# Altium footprint library DIY Air Quality Monitor Library.PcbLib: 11 footprints
Each footprint in its own frame and in the unit in brackets; x right, y up, seen from the top. Pads: shape width x height; smd on the part's side, far side on the other; paste and mask are expansions set on the pad; w line width, h text height; cw(c..) or ccw(c..) is an arc to the next point about the centre after c.
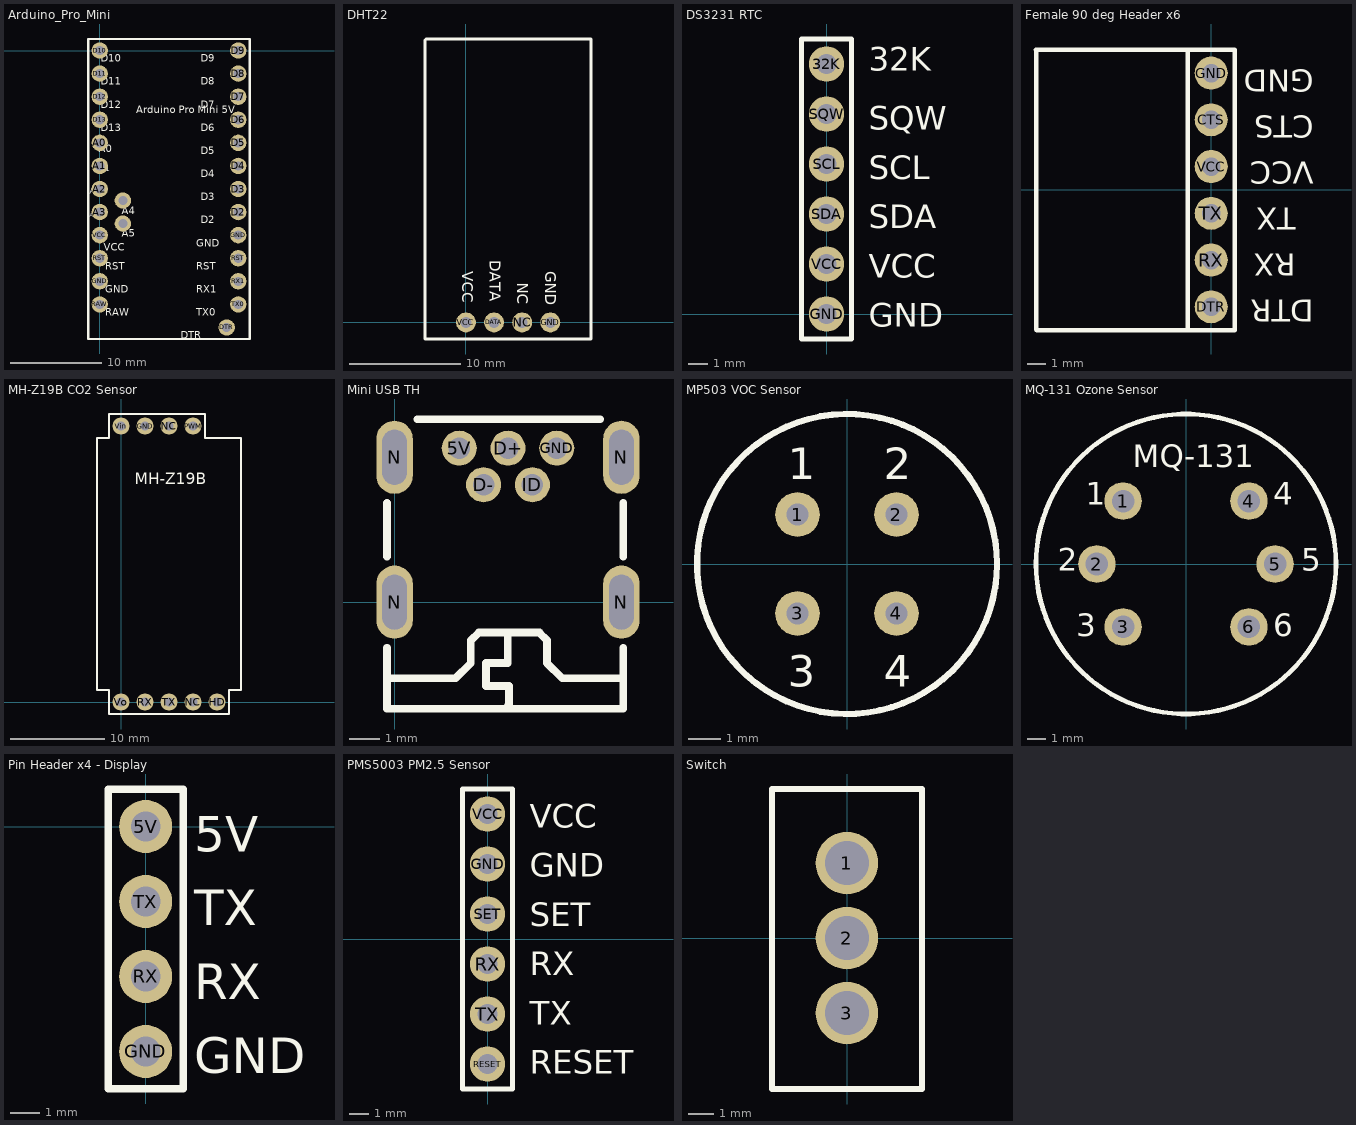
[diagram p0: the footprints below, top view; thin cyan lines are the x and y axes]

## Arduino_Pro_Mini [mm] "5V Board"
pads (27):
  round 1.8 hole 1: A0(0,-10.16) A1(0,-12.7) A2(0,-15.24) A3(0,-17.78) A4/SDA(2.54,-16.51) A5/SCL(2.54,-19.05) D2(15.24,-17.78) D3(15.24,-15.24) D4(15.24,-12.7) D5(15.24,-10.16) D6(15.24,-7.62) D7(15.24,-5.08) D8(15.24,-2.54) D9(15.24,0) D10(0,0) D11(0,-2.54) D12(0,-5.08) D13(0,-7.62) DTR(13.97,-30.48) GND(0,-25.4) GND(15.24,-20.32) RAW(0,-27.94) RST(0,-22.86) RST(15.24,-22.86) RX1(15.24,-25.4) TX0(15.24,-27.94) VCC(0,-20.32)
Top Overlay:
  lines w0.254: -1.27,-31.75 -1.27,1.27 16.51,1.27 16.51,-31.75 -1.27,-31.75
  text "D8" at 11.095,-3.79 h0.8
  text "D7" at 11.095,-6.33 h0.8
  text "D6" at 11.095,-8.87 h0.8
  text "D5" at 11.095,-11.41 h0.8
  text "D4" at 11.095,-13.95 h0.8
  text "D3" at 11.095,-16.49 h0.8
  text "D2" at 11.095,-19.03 h0.8
  text "GND" at 10.628,-21.57 h0.8
  text "RST" at 10.628,-24.11 h0.8
  text "RX1" at 10.628,-26.65 h0.8
  text "TX0" at 10.628,-29.19 h0.8
  text "D9" at 11.095,-1.25 h0.8
  text "D11" at 0.095,-3.79 h0.8
  text "D12" at 0.095,-6.33 h0.8
  text "D13" at 0.095,-8.87 h0.8
  text "A0" at -0.112,-11.2 h0.8
  text "A1" at -0.112,-13.28 h0.7
  text "VCC" at 0.428,-22.02 h0.8
  text "RST" at 0.595,-24.11 h0.8
  text "GND" at 0.595,-26.65 h0.8
  text "RAW" at 0.595,-29.19 h0.8
  text "A2" at -1.112,-15.78 h0.6
  text "A5" at 2.428,-20.52 h0.8
  text "Arduino Pro Mini 5V" at 4.028,-6.887 h0.8
  text "D10" at 0.095,-1.25 h0.8
  text "DTR" at 8.935,-31.73 h0.8
  text "A3" at -1.112,-18.28 h0.4
  text "A4" at 2.428,-18.02 h0.8
3D body "Arduino Pro Mini Board 3D Model.STEP": height 6.61, standoff -5.7, extent -1.63,-32 16.87,1.5

## DHT22 [mm]
pads (4):
  round 1.8 hole 1: DATA(2.54,0) GND(7.62,0) NC(5.08,0) VCC(0,0)
Top Overlay:
  lines w0.254: -3.7,-1.5 11.3,-1.5 11.3,25.6 -3.6,25.6 -3.7,25.5 -3.7,-1.5
  text "NC" at 4.65,3.6 h1
  text "GND" at 7.15,4.6 h1
  text "DATA" at 2.15,5.6 h1
  text "VCC" at -0.35,4.6 h1
3D body "DHT22 v5.STEP": height 7.8, standoff -5.05, extent -3.84,-0.3 11.46,25.45

## DS3231 RTC [mm] "DS3231 RTC"
pads (6):
  round 1.8 hole 1: 32K(0,12.7) GND(0,0) SCL(0,7.62) SDA(0,5.08) SQW(0,10.16) VCC(0,2.54)
Top Overlay:
  lines w0.254: -1.27,-1.27 -1.27,13.97 1.27,13.97 1.27,-1.27 -1.27,-1.27
  text "GND" at 2.15,-0.65 h1.2
  text "VCC" at 2.15,1.85 h1.2
  text "SDA" at 2.15,4.35 h1.2
  text "SCL" at 2.15,6.85 h1.2
  text "SQW" at 2.15,9.35 h1.2
  text "32K" at 2.15,12.35 h1.2
3D body "DS3231 Real Time Clock Module.STEP": height 13.41, standoff -5.7, extent -37.23,-4.9 1.27,17.6

## Female 90 deg Header x6 [mm] "Female 90 deg Header x6"
pads (6):
  round 1.8 hole 1: CTS(0,3.81) DTR(0,-6.35) GND(0,6.35) RX(0,-3.81) TX(0,-1.27) VCC(0,1.27)
Top Overlay:
  lines w0.254: -1.27,-7.62 -9.48,-7.62 -9.5,-7.6 -9.5,7.6 -9.52,7.62 -1.27,7.62 ; -1.27,-7.62 -1.27,7.62 ; -1.27,-7.62 1.27,-7.62 1.27,7.62 -1.27,7.62
  text "GND" at 5.58,6.523 h1.2
  text "CTS" at 5.58,4.023 h1.2
  text "VCC" at 5.58,1.523 h1.2
  text "TX" at 4.58,-0.977 h1.2
  text "RX" at 4.58,-3.477 h1.2
  text "DTR" at 5.58,-5.977 h1.2
3D body "Female 90 deg Header x6.STEP": height 2.52, standoff -2.25, extent -9.5,-7.62 0.2,7.62

## MH-Z19B CO2 Sensor [mm]
pads (9):
  round 1.8 hole 1: GND(2.54,29.21) HD(10.16,0) NC(5.08,29.21) NC(7.62,0) PWM(7.62,29.21) RX(2.54,0) TX(5.08,0) Vin(0,29.21) Vo(0,0)
Top Overlay:
  lines w0.254: -2.54,1.27 -2.54,27.94 -1.27,27.94 -1.27,30.48 8.89,30.48 8.89,27.94 12.7,27.94 12.7,1.27 11.43,1.27 11.43,-1.27 -1.27,-1.27 -1.27,1.27 -2.54,1.27
  text "MH-Z19B" at 1.47,23.06 h1.2
3D body "MH-Z19B CO2 Sensor - with pin headers.STEP": height 11.31, standoff -5.7, extent -4.6,-1.35 15.4,30.55

## Mini USB TH [mm]
pads (9):
  round 1.15 hole 0.7: 5V(2.12,5.05) D+(3.72,5.05) D-(2.92,3.85) GND(5.32,5.05) ID(4.52,3.85)
  oval 1.2x2.4 hole 0.8 slot 1.8 at 90 deg: N(0,0) N(0,4.75) N(7.44,0) N(7.44,4.75)
Top Overlay:
  lines w0.254: -0.25,-2.5 2,-2.5 2.5,-2 2.5,-1.26 2.76,-1 4.75,-1 5,-1.25 5,-2 5.5,-2.5 7.5,-2.5 ; -0.25,-1.5 -0.25,-3.5 7.5,-3.5 7.5,-1.5 ; -0.25,1.5 -0.25,3.25 ; 0.75,6 6.75,6 ; 3.625,-3.5 3.75,-3.375 3.75,-2.75 3.458,-2.75 3,-2.75 3,-2 3.25,-2 3.713,-2 3.713,-1 ; 7.5,1.5 7.5,3.25
3D body "Mini USB TH.stp": height 3.95, standoff -1.8, extent -0.15,-3.7 7.55,5.3

## MP503 VOC Sensor [mm]
pads (4):
  round 1.4 hole 0.7: 1(-1.55,1.55) 2(1.55,1.55) 3(-1.55,-1.55) 4(1.55,-1.55)
Top Overlay:
  circle w0.2: c0,0 r4.7
  text "2" at 1.15,2.65 h1
  text "1" at -1.85,2.65 h1
  text "3" at -1.85,-3.85 h1
  text "4" at 1.15,-3.85 h1
3D body "MP503 VOC Sensor v3.step": height 8.1, standoff -2, extent -4.7,-4.7 4.7,5.5

## MQ-131 Ozone Sensor [mm]
pads (6):
  round 2 hole 1.2: 1(-3.359,3.359) 2(-4.75,0) 3(-3.359,-3.359) 4(3.359,3.359) 5(4.75,0) 6(3.359,-3.359)
Top Overlay:
  circle w0.254: c0,0 r8
  text "MQ-131" at -2.85,5.15 h1.2
  text "1" at -5.35,3.15 h1.2
  text "2" at -6.85,-0.35 h1.2
  text "3" at -5.85,-3.85 h1.2
  text "6" at 4.65,-3.85 h1.2
  text "5" at 6.15,-0.35 h1.2
  text "4" at 4.65,3.15 h1.2
3D body "MQ-131 Ozone Sensor.STEP": height 14, standoff -7.5, extent -8,-8 8,8

## Pin Header x4 - Display [mm] "Pin Header x4 - Display"
pads (4):
  round 1.8 hole 1: 5V(0,0) GND(0,-7.62) RX(0,-5.08) TX(0,-2.54)
Top Overlay:
  lines w0.254: -1.27,-8.89 1.27,-8.89 1.27,1.27 -1.27,1.27 -1.27,-8.89
  text "5V" at 1.65,-0.85 h1.2
  text "TX" at 1.65,-3.35 h1.2
  text "RX" at 1.65,-5.85 h1.2
  text "GND" at 1.65,-8.35 h1.2
3D body "Pin header x4.STEP": height 8.2, standoff -3, extent -1.25,-8.87 1.25,1.25

## PMS5003 PM2.5 Sensor [mm] "PMS5003 PM2.5 Sensor"
pads (6):
  round 1.8 hole 1: GND(0,3.81) RESET(0,-6.35) RX(0,-1.27) SET(0,1.27) TX(0,-3.81) VCC(0,6.35)
Top Overlay:
  lines w0.254: -1.27,-7.62 -1.27,7.62 1.27,7.62 1.27,-7.62 -1.27,-7.62
  text "VCC" at 2.15,5.65 h1.2
  text "GND" at 2.15,3.15 h1.2
  text "SET" at 2.15,0.65 h1.2
  text "RX" at 2.15,-1.85 h1.2
  text "TX" at 2.15,-4.35 h1.2
  text "RESET" at 2.15,-6.85 h1.2
3D body "Female Header x6.STEP": height 8.5, standoff -3, extent -1.27,-7.62 1.27,7.62

## Switch [mm]
pads (3):
  round 2.5 hole 1.75: 1(0,3) 2(0,0) 3(0,-3)
Top Overlay:
  lines w0.254: -3,-6.039 -3,5.961 3,5.961 3,-6.039 -3,-6.039
3D body "Switch - 3 pin sliding.STEP": height 10.5, standoff -3, extent -2.85,-5.5 2.85,5.5